# Altium footprint library PCB_Wearing_sensor.PcbLib: 55 footprints (part 1 of 4)
Each footprint in its own frame and in the unit in brackets; x right, y up, seen from the top. Pads: shape width x height; smd on the part's side, far side on the other; paste and mask are expansions set on the pad; w line width, h text height; cw(c..) or ccw(c..) is an arc to the next point about the centre after c.
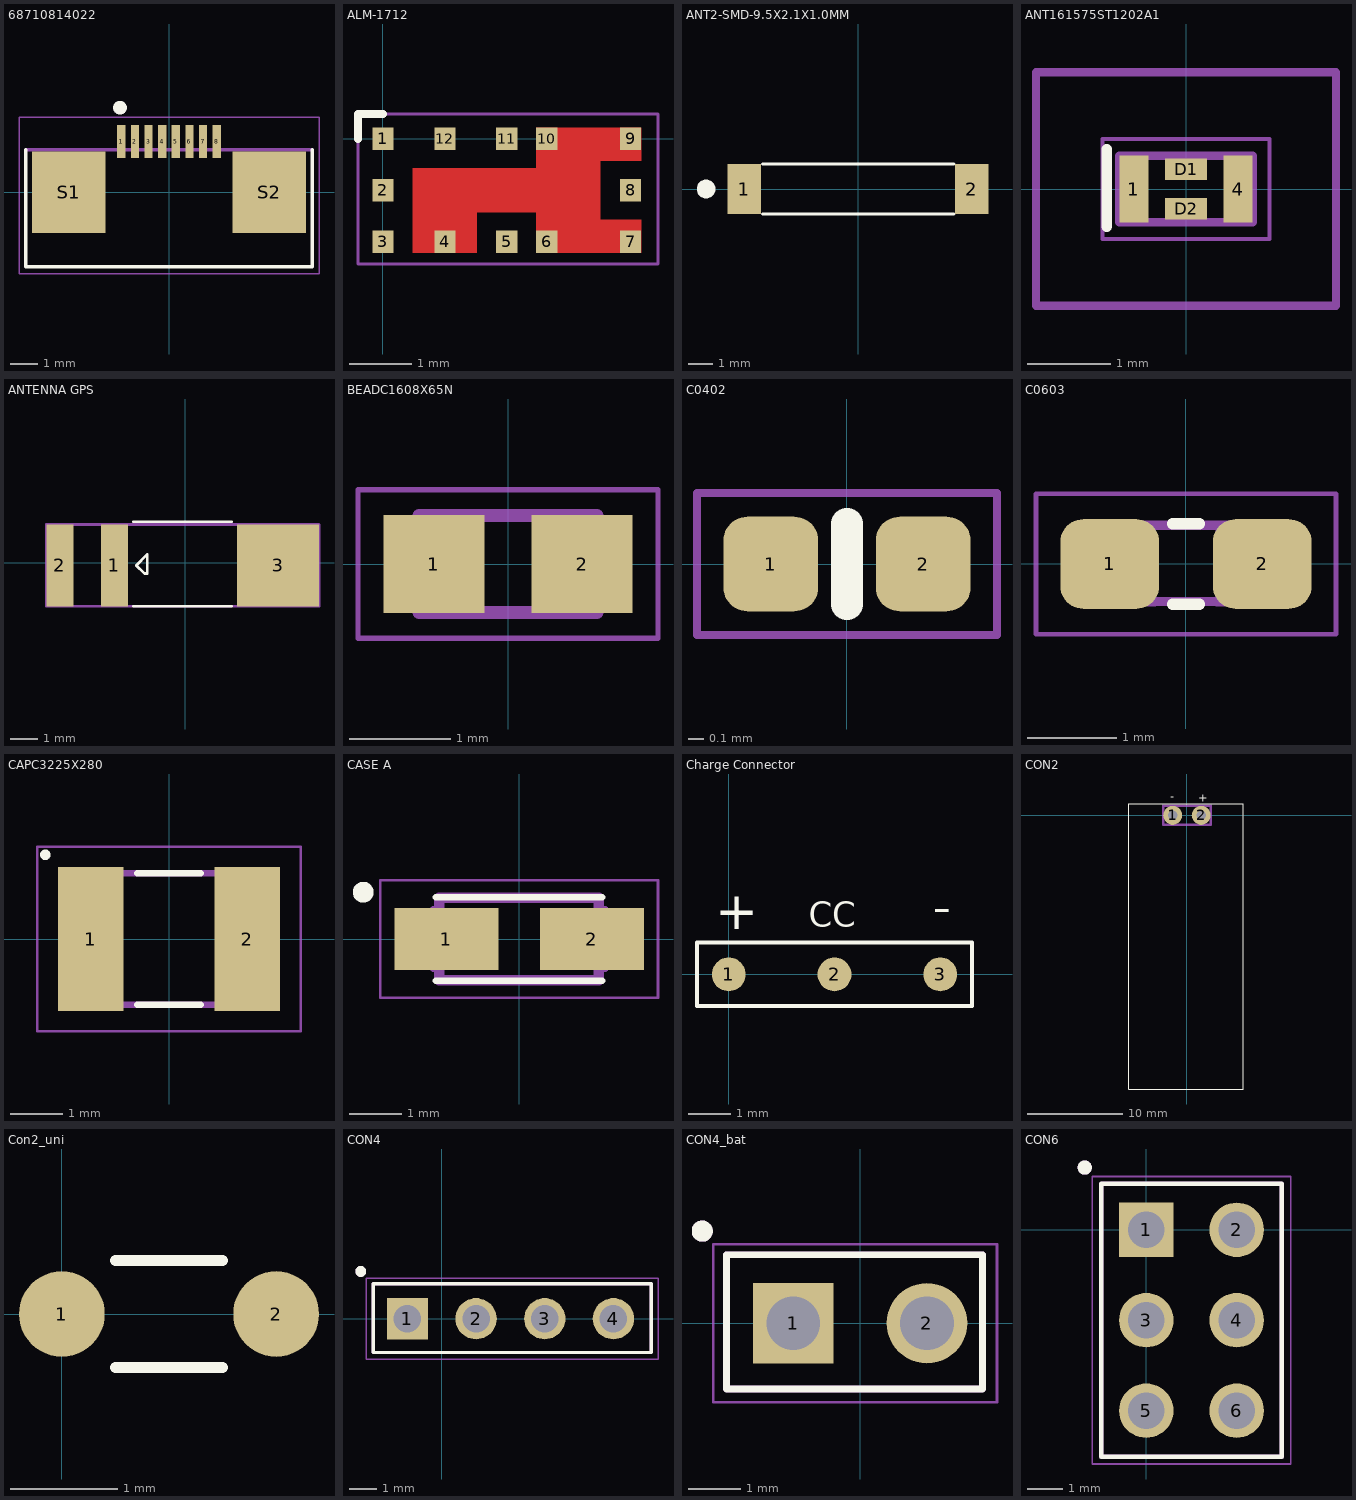
[diagram p0: the footprints below, top view; thin cyan lines are the x and y axes]

## 68710814022 [mm]
pads (10):
  rect 0.3x1.2 smd: 1(-1.75,1.86) 2(-1.25,1.86) 3(-0.75,1.86) 4(-0.25,1.86) 5(0.25,1.86) 6(0.75,1.86) 7(1.25,1.86) 8(1.75,1.86)
  rect 2.7x3 smd: S1(-3.68,0) S2(3.68,0)
Top Overlay:
  circle w0.254: c-1.8,3.1 r0.127
  lines w0.127: -5.25,1.56 -5.25,-2.74 5.25,-2.74 5.25,1.56
Top Courtyard (Mech8):
  lines w0.05: -5.5,-2.99 -5.5,2.75 5.5,2.75 5.5,-2.99 -5.5,-2.99
Mechanical 13:
  lines w0.127: -5.25,1.56 5.25,1.56
3D body "68710814022.stp": height 2.05, standoff -0.05, extent -5.2,-2.8 5.2,2.3

## ALM-1712 [mm]
pads (12):
  rect 0.34x0.36 smd: 1(0,0) 2(0,-0.82) 3(0,-1.64) 4(0.99,-1.64) 5(1.98,-1.64) 6(2.62,-1.64) 7(3.96,-1.64) 8(3.96,-0.82) 9(3.96,0) 10(2.62,0) 11(1.98,0) 12(0.99,0)
Top Layer:
  region: 0.48,-1.82 0.48,-0.47 2.45,-0.47 2.45,0.18 4.13,0.18 4.13,-0.345 3.48,-0.345 3.48,-1.295 4.13,-1.295 4.13,-1.82 2.45,-1.82 2.45,-1.17 1.5,-1.17 1.5,-1.82
Top Overlay:
  lines w0.127: -0.4,0 -0.4,0.4 0,0.4
Top Courtyard (Mech8):
  lines w0.05: -0.4,-2 4.4,-2 4.4,0.4 -0.4,0.4 -0.4,-2

## ANT2-SMD-9.5X2.1X1.0MM [mm]
pads (2):
  rect 1.4x2.1 smd: 1(-4.75,0) 2(4.75,0)
Top Overlay:
  region: -6.35,-0.381 -6.426,-0.381 -6.566,-0.323 -6.673,-0.216 -6.731,-0.076 -6.731,0 -6.731,0.076 -6.673,0.216 -6.566,0.323 -6.426,0.381 -6.35,0.381 -6.274,0.381 -6.134,0.323 -6.027,0.216 -5.969,0.076 -5.969,0 -5.969,-0.076 -6.027,-0.216 -6.134,-0.323 -6.274,-0.381
  lines w0.127: -4,-1.05 4,-1.05 ; -4,1.05 4,1.05

## ANT161575ST1202A1 [mm]
pads (4):
  rect 0.35x0.8 smd: 1(-0.625,0) 4(0.625,0)
  rect 0.5x0.26 smd: D1(0,0.235) D2(0,-0.235)
Top Overlay:
  lines w0.127: -0.95,-0.45 -0.95,0.475
Top Component Body:
  lines w0.1: -0.8,-0.4 0.8,-0.4 0.8,0.4 -0.8,0.4 -0.8,-0.4
Top Courtyard (Mech8):
  lines w0.05: -1,-0.6 1,-0.6 1,0.6 -1,0.6 -1,-0.6
Mechanical 20:
  lines w0.1: -1.8,-1.4 1.8,-1.4 1.8,1.4 -1.8,1.4 -1.8,-1.4
3D body "ANT161575ST-1202A1.stp": height 0.4, standoff 0, extent -0.85,-0.45 0.85,0.45

## ANTENNA GPS [mm]
pads (3):
  rect 1x3 smd: 1(-2.6,-0.1) 2(-4.6,-0.1)
  rect 3x3 smd: 3(3.4,-0.1)
Top Overlay:
  lines w0.1: -1.9,-1.6 1.7,-1.6 ; -1.9,1.5 1.7,1.5 ; -1.4,-0.05 -1.4,-0.4 ; -1.4,-0.4 -1.5,-0.4 -1.8,-0.1 -1.4,0.3 -1.4,-0.4
Top Component Body:
  lines w0.1: -5.1,-1.6 4.9,-1.6 4.9,1.4 -5.1,1.4 -5.1,-1.6
Top Assy:
  text ".Designator" at -2.253,-0.226 h1
3D body "Антенна GPS.STEP": height 3.1, standoff 0.05, extent -5.1,-1.6 4.9,1.4

## BEADC1608X65N [mm]
pads (2):
  rect 1x0.97 smd: 1(-0.735,0) 2(0.735,0)
Top Component Body:
  lines w0.127: -0.88,-0.48 0.88,-0.48 0.88,0.48 -0.88,0.48 -0.88,-0.48
Top Assy:
  text ".Designator" at -3.432,-0.345 h1.52
Top Courtyard (Mech8):
  lines w0.05: -1.485,-0.735 1.485,-0.735 1.485,0.735 -1.485,0.735 -1.485,-0.735
3D body "BLM18EG331TH1D.STEP": height 0.65, standoff 0, extent -0.8,-0.4 0.8,0.4

## C0402 [mm]
pads (2):
  rrect50% 0.6x0.6 smd: 1(-0.482,0) 2(0.483,0)
Top Overlay:
  lines w0.2: 0,-0.254 0,0 0,0.254
Top Courtyard (Mech8):
  lines w0.05: -0.95,-0.45 0.95,-0.45 0.95,0.45 -0.95,0.45 -0.95,-0.45
3D body "CL05B104KO5NNNC--3DModel-STEP-510211.STEP": height 0.55, standoff 0, extent -0.505,-0.256 0.495,0.244

## C0603 [mm]
pads (2):
  rrect50% 1.1x1 smd: 1(-0.85,0) 2(0.85,0)
Top Overlay:
  lines w0.127: -0.15,-0.45 0.15,-0.45 ; -0.15,0.45 0.15,0.45
Top Courtyard (Mech8):
  lines w0.051: -1.673,-0.783 1.673,-0.783 1.673,0.783 -1.673,0.783 -1.673,-0.783
Mechanical 13:
  region: -0.338,-0.47 -0.839,-0.47 -0.839,0.48 -0.338,0.48
  region: 0.83,-0.471 0.331,-0.471 0.331,0.48 0.83,0.48
  lines w0.102: -0.356,-0.419 0.356,-0.419 ; -0.356,0.432 0.356,0.432
3D body "LD03ZD475MAB2A.STEP": height 0.9, standoff 0, extent -0.8,-0.405 0.8,0.405

## CAPC3225X280 [mm]
pads (2):
  rect 1.24x2.73 smd: 1(-1.485,0) 2(1.485,0)
Top Overlay:
  circle w0.1: c-2.35,1.6 r0.05
  lines w0.127: -0.6,-1.25 0.6,-1.25 ; -0.6,1.25 0.6,1.25
Top Courtyard (Mech8):
  lines w0.05: -2.5,-1.75 2.5,-1.75 2.5,1.75 -2.5,1.75 -2.5,-1.75
Mechanical 13:
  region: 1.6,-1.25 1.1,-1.25 1.1,1.25 1.6,1.25
  region: -1.1,-1.25 -1.6,-1.25 -1.6,1.25 -1.1,1.25
  lines w0.127: -1.6,-1.25 -1.6,1.25 1.6,1.25 1.6,-1.25 -1.6,-1.25

## CASE A [mm]
pads (2):
  rect 2x1.2 smd: 1(-1.4,0) 2(1.4,0)
Top Overlay:
  circle w0.2: c-3,0.9 r0.1
  lines w0.127: -1.6,-0.8 1.6,-0.8 ; -1.6,0.8 1.6,0.8
Top Component Body:
  lines w0.152: -1.651,-0.559 -1.651,0.559 ; 1.651,-0.559 1.651,0.559
  lines w0.203: -1.535,-0.798 1.535,-0.798 1.535,0.798 -1.535,0.798 -1.535,-0.798
Top Assy:
  text ".Designator" at -3.432,-0.345 h1.52
Top Courtyard (Mech8):
  lines w0.051: -2.673,-1.133 -2.673,1.133 2.673,1.133 2.673,-1.133 -2.673,-1.133
3D body "step_temp.STEP": height 1.55, standoff -0.05, extent -1.4,-0.85 1.8,0.85

## Charge Connector [mm]
pads (3):
  round 0.8 smd: 1(0,0) 2(2.5,0) 3(5,0)
Top Overlay:
  lines w0.1: -0.75,-0.75 5.75,-0.75 5.75,0.75 -0.75,0.75 -0.75,-0.75
  text "CC" at 1.894,0.93 h1
  text "-" at 4.816,0.897 h1.52
  text "+" at -0.322,0.77 h1.52
Top Assy:
  text ".Designator" at -0.932,-0.345 h1.52

## CON2 [mm]
pads (2):
  round 2 hole 1: 1(-1.5,0) 2(1.5,0)
Top Overlay:
  lines w0.1: -6.1,-28.8 5.9,-28.8 5.9,1.2 -6.1,1.2 -6.1,-28.8
  text "+" at 1.178,1.12 h1.52
  text "-" at -1.784,1.247 h1.52
Top Component Body:
  lines w0.254: -2.5,-1 2.5,-1 2.5,1 -2.5,1 -2.5,-1
Top Assy:
  text ".Designator" at -3.432,-0.345 h1.52
3D body "Аккум.STEP": height 4, standoff 0, extent -6.1,-28.8 5.9,1.2

## Con2_uni [mm]
pads (2):
  round 0.8 smd: 1(0,0) 2(2,0)
Top Overlay:
  lines w0.1: 0.5,-0.5 1.5,-0.5 ; 0.5,0.5 1.5,0.5
Top Assy:
  text ".Designator" at -1.253,-0.226 h1

## CON4 [mm]
pads (4):
  rect 1.53x1.53 hole 1.02: 1(-1.27,0)
  round 1.53 hole 1.02: 2(1.27,0) 3(3.81,0) 4(6.35,0)
Top Overlay:
  circle w0.2: c-3,1.75 r0.1
  lines w0.127: -2.54,-1.25 7.75,-1.25 7.75,1.3 -2.54,1.3 -2.54,-1.25
Top Component Body:
  circle w0.2: c-3,1.75 r0.1
  lines w0.127: -2.54,-1.25 -2.54,1.3 7.75,1.3 7.75,-1.25 -2.54,-1.25
Top Assy:
  text ".Designator" at -0.932,-0.345 h1.52
Top Courtyard (Mech8):
  lines w0.05: -2.79,-1.5 -2.79,1.5 8,1.5 8,-1.5 -2.79,-1.5
3D body "User Library-1x4 TH Pitch 2_54mm.STEP": height 9.2, standoff -3.5, extent -2.505,-1.225 7.655,1.315

## CON4_bat [mm]
pads (2):
  rect 1.53x1.53 hole 1.02: 1(-1.27,0)
  round 1.53 hole 1.02: 2(1.27,0)
Top Overlay:
  circle w0.2: c-3,1.75 r0.1
  lines w0.127: -2.54,-1.25 -2.54,1.3 2.325,1.3 2.325,-1.25 -2.54,-1.25
Top Component Body:
  circle w0.2: c-3,1.75 r0.1
  lines w0.127: -2.54,-1.25 2.325,-1.25 2.325,1.3 -2.54,1.3 -2.54,-1.25
Top Assy:
  text ".Designator" at -3.432,-0.345 h1.52
Top Courtyard (Mech8):
  lines w0.05: -2.79,-1.5 2.6,-1.5 2.6,1.5 -2.79,1.5 -2.79,-1.5

## CON6 [mm]
pads (6):
  rect 1.53x1.53 hole 1.02: 1(0,0)
  round 1.53 hole 1.02: 2(2.54,0) 3(0,-2.54) 4(2.54,-2.54) 5(0,-5.08) 6(2.54,-5.08)
Top Overlay:
  circle w0.2: c-1.73,1.75 r0.1
  lines w0.127: -1.27,-6.38 3.81,-6.38 3.81,1.3 -1.27,1.3 -1.27,-6.38
Top Component Body:
  circle w0.2: c-1.73,1.75 r0.1
  lines w0.127: -1.27,-6.38 -1.27,1.3 3.81,1.3 3.81,-6.38 -1.27,-6.38
Top Assy:
  text ".Designator" at 1.62,-5.907 h1.52
Top Courtyard (Mech8):
  lines w0.05: -1.52,-1.5 -1.52,1.5 ; -1.52,1.5 4.06,1.5 4.06,-6.58 -1.52,-6.58 -1.52,1.5